# Altium footprint library North POLE.PcbLib: 419 footprints (part 2 of 27)
Each footprint in its own frame and in the unit in brackets; x right, y up, seen from the top. Pads: shape width x height; smd on the part's side, far side on the other; paste and mask are expansions set on the pad; w line width, h text height; cw(c..) or ccw(c..) is an arc to the next point about the centre after c.
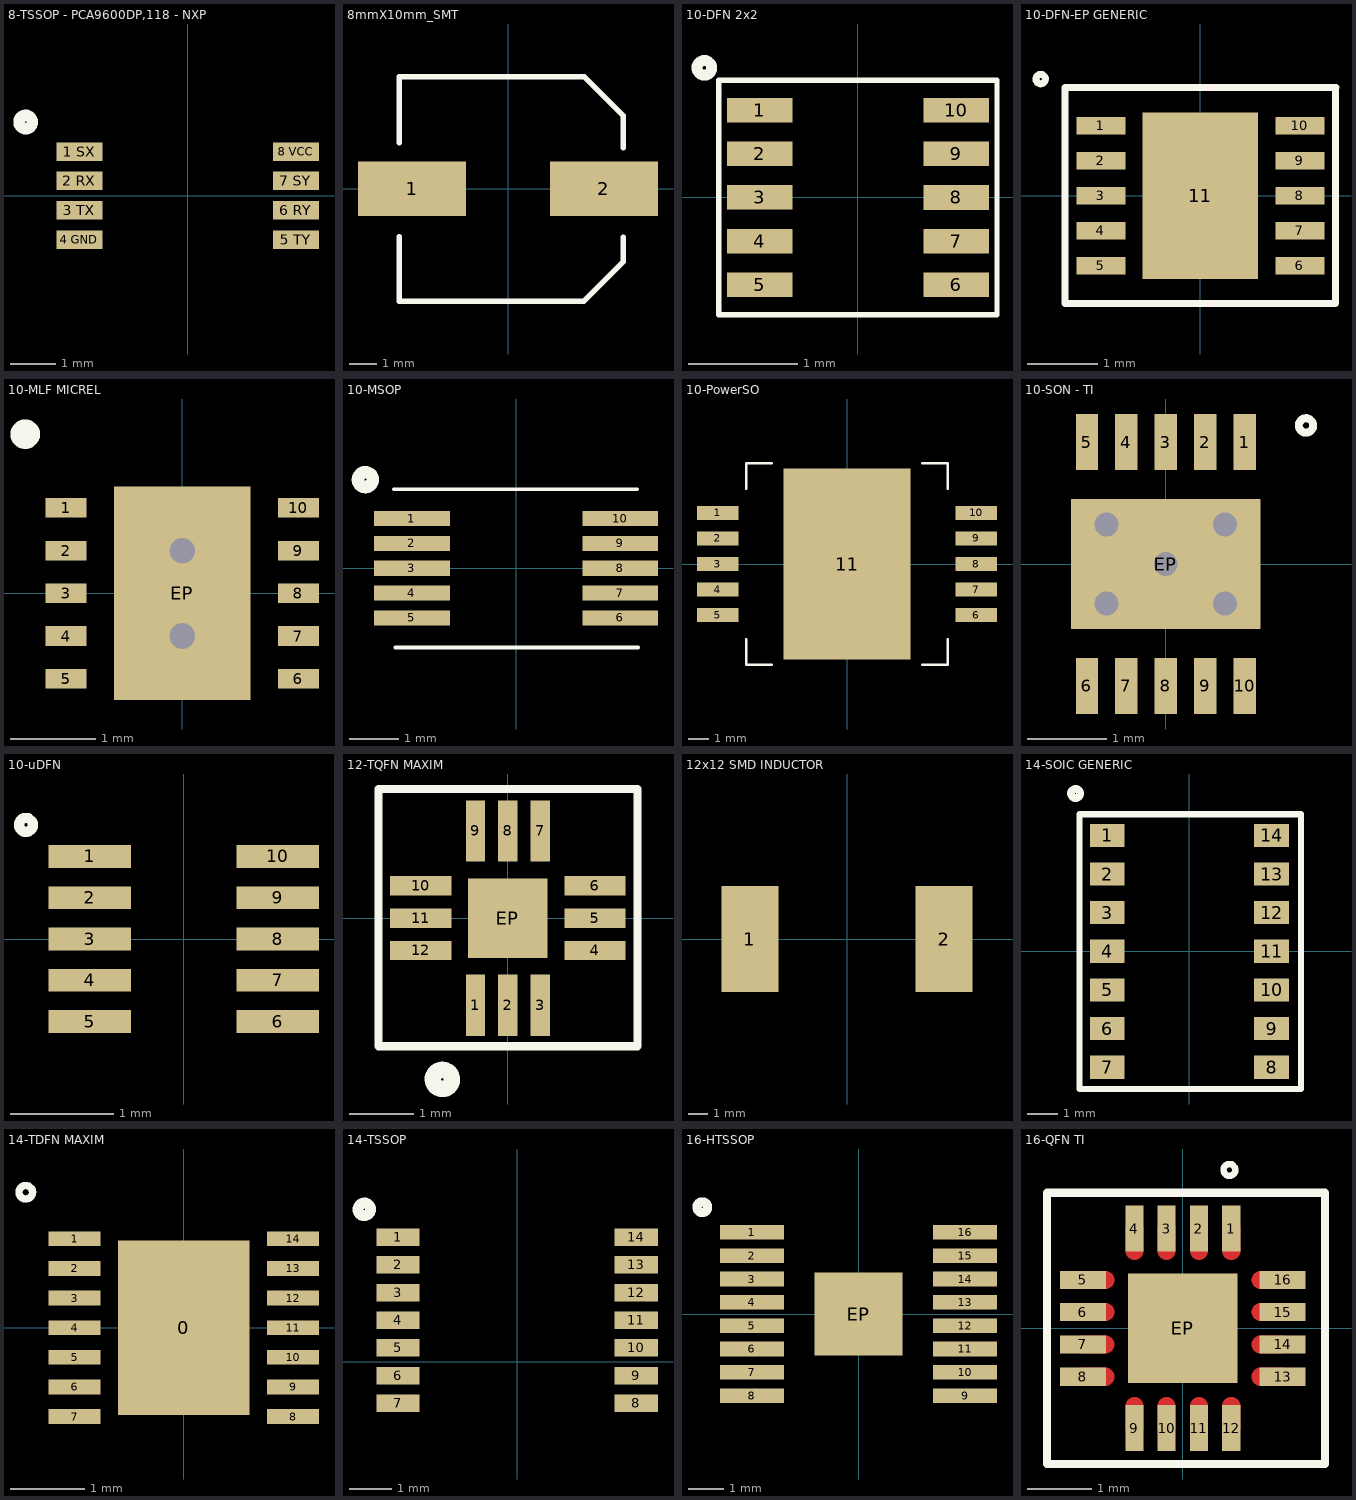
[diagram p1: the footprints below, top view; thin cyan lines are the x and y axes]

## 8-TSSOP - PCA9600DP,118 - NXP [mm]
pads (8):
  rect 1.02x0.41 smd: "1 SX"(-2.4,0.975) "2 RX"(-2.4,0.325) "3 TX"(-2.4,-0.325) "4 GND"(-2.4,-0.975) "5 TY"(2.4,-0.975) "6 RY"(2.4,-0.325) "7 SY"(2.4,0.325) "8 VCC"(2.4,0.975)
Top Overlay:
  lines w0.254: -3.501,1.748 ccw(c-3.592,1.631) -3.48,1.727

## 8mmX10mm_SMT [mm]
pads (2):
  rect 4x2 smd: 1(-3.55,0) 2(3.55,0)
Top Overlay:
  lines w0.2: -4.03,-1.77 -4.03,-4.16 2.807,-4.16 4.26,-2.707 4.26,-1.8 ; -4.03,1.7 -4.03,4.14 2.827,4.14 4.26,2.707 4.26,1.52

## 10-DFN 2x2 [mm]
pads (10):
  rect 0.6x0.225 smd mask+0.04: 1(-0.9,0.8) 2(-0.9,0.4) 3(-0.9,0) 4(-0.9,-0.4) 5(-0.9,-0.8) 6(0.9,-0.8) 7(0.9,-0.4) 8(0.9,0) 9(0.9,0.4) 10(0.9,0.8)
Top Overlay:
  lines w0.05: -1.275,-1.075 -1.275,1.075 1.275,1.075 1.275,-1.075 -1.275,-1.075
  lines w0.1: -1.372,1.246 ccw(c-1.406,1.188) -1.35,1.225
Top Solder:
  rectangle: -1.25,-0.95 -0.55,0.95
  rectangle: 0.55,-0.95 1.25,0.95
3D body: height 0.9, standoff 0, extent -1,-1 1,1

## 10-DFN-EP GENERIC [mm]
pads (11):
  rect 0.7x0.25 smd mask+0.04: 1(-1.425,1) 2(-1.425,0.5) 3(-1.425,0) 4(-1.425,-0.5) 5(-1.425,-1) 6(1.425,-1) 7(1.425,-0.5) 8(1.425,0) 9(1.425,0.5) 10(1.425,1)
  rect 1.65x2.38 smd mask+0.04: 11(0,0)
Top Overlay:
  lines w0.1: -2.25,1.727 ccw(c-2.285,1.669) -2.229,1.707 ; 1.935,1.544 1.935,-1.544 -1.935,-1.544 -1.935,1.549 1.941,1.549
3D body: height 0.75, standoff 0, extent -1.631,-1.407 1.623,1.44

## 10-MLF MICREL [mm]
pads (11):
  rect 0.48x0.23 smd mask+0.05: 1(-1.36,1) 2(-1.36,0.5) 3(-1.36,0) 4(-1.36,-0.5) 5(-1.36,-1) 6(1.36,-1) 7(1.36,-0.5) 8(1.36,0) 9(1.36,0.5) 10(1.36,1)
  rect 1.6x2.5 smd mask+0.05: EP(0,0)
via 0,0.5 diameter 0.45 hole 0.3
via 0,-0.5 diameter 0.45 hole 0.3
Top Overlay:
  lines w0.2: -1.8,1.926 ccw(c-1.838,1.864) -1.778,1.905
3D body: height 0.6, standoff 0, extent -1.499,-1.511 1.499,1.511

## 10-MSOP [mil]
pads (10):
  rect 60x12.01 smd mask+2.95: 1(-82.5,39.37) 2(-82.5,19.69) 3(-82.5,0) 4(-82.5,-19.68) 5(-82.5,-39.37) 6(82.5,-39.37) 7(82.5,-19.69) 8(82.5,0) 9(82.5,19.68) 10(82.5,39.37)
Top Overlay:
  lines w3: -96.85,62.56 95.75,62.56 ; -95.71,-62.95 96.89,-62.95
  lines w10: -115.85,74.81 ccw(c-119.43,70.21) -115,74
3D body: height 45.28, standoff 0, extent -96.45,-59.05 96.46,59.06

## 10-PowerSO [mm]
pads (11):
  rect 2.05x0.7 smd mask+0.08: 1(-6.425,2.54) 2(-6.425,1.27) 3(-6.425,0) 4(-6.425,-1.27) 5(-6.425,-2.54) 6(6.425,-2.54) 7(6.425,-1.27) 8(6.425,0) 9(6.425,1.27) 10(6.425,2.54)
  rect 6.3x9.5 smd mask+0.08: 11(0,0)
Top Overlay:
  lines w0.127: -5,-3.75 -5,-5 -3.75,-5 ; -5,3.75 -5,5 -3.75,5 ; 3.75,-5 5,-5 5,-3.75 ; 3.75,5 5,5 5,3.75
3D body: height 3.7, standoff 0, extent -4.75,-4.5 4.75,4.5
3D body: height 1.35, standoff 0, extent -3.8,-4.8 3.8,4.8

## 10-SON - TI [mm]
pads (11):
  rect 0.28x0.71 smd paste+0 mask+0.05: 1(1,1.545) 2(0.5,1.545) 3(0,1.545) 4(-0.5,1.545) 5(-1,1.545) 6(-1,-1.545) 7(-0.5,-1.545) 8(0,-1.545) 9(0.5,-1.545) 10(1,-1.545)
  rect 2.4x1.65 smd mask+0.05: EP(0,0)
via 0.75,-0.5 diameter 0.45 hole 0.3
via -0.75,-0.5 diameter 0.45 hole 0.3
via 0.75,0.5 diameter 0.45 hole 0.3
via 0,0 diameter 0.45 hole 0.3
via -0.75,0.5 diameter 0.45 hole 0.3
Top Overlay:
  lines w0.1: 1.826,1.832 ccw(c1.776,1.755) 1.854,1.803
3D body: height 1, standoff 0, extent -1.499,-1.498 1.499,1.499

## 10-uDFN [mm]
pads (10):
  rect 0.8x0.22 smd mask+0.04: 1(-0.91,0.8) 2(-0.91,0.4) 3(-0.91,0) 4(-0.91,-0.4) 5(-0.91,-0.8) 6(0.91,-0.8) 7(0.91,-0.4) 8(0.91,0) 9(0.91,0.4) 10(0.91,0.8)
Top Overlay:
  lines w0.1: -1.495,1.164 ccw(c-1.529,1.106) -1.473,1.143
3D body: height 0.75, standoff 0, extent -1.016,-1.016 1.067,1.016

## 12-TQFN MAXIM [mm]
pads (13):
  rect 0.3x0.95 smd mask+0.05: 1(-0.5,-1.35) 2(0,-1.35) 3(0.5,-1.35) 7(0.5,1.35) 8(0,1.35) 9(-0.5,1.35)
  rect 0.95x0.3 smd mask+0.05: 4(1.35,-0.5) 5(1.35,0) 6(1.35,0.5) 10(-1.35,0.5) 11(-1.35,0) 12(-1.35,-0.5)
  rect 1.23x1.23 smd mask+0.05: EP(0,0)
Top Overlay:
  lines w0.127: -2,-1.981 -2,2 2.007,2 2.007,-1.981 -2,-1.981
  lines w0.254: -0.922,-2.379 ccw(c-1.012,-2.496) -0.9,-2.4
3D body: height 0.6, standoff 0, extent -1.499,-1.499 1.499,1.524

## 12x12 SMD INDUCTOR [mm]
pads (2):
  rect 2.9x5.4 smd mask+0.08: 1(-4.95,0) 2(4.95,0)
3D body: height 6.21, standoff -0.09, extent -5.973,-6.147 6.227,6.053

## 14-SOIC GENERIC [mil]
pads (14):
  rect 45x30 smd: 1(-106.3,150) 2(-106.3,100) 3(-106.3,50) 4(-106.3,0) 5(-106.3,-50) 6(-106.3,-100) 7(-106.3,-150) 8(106.3,-150) 9(106.3,-100) 10(106.3,-50) 11(106.3,0) 12(106.3,50) 13(106.3,100) 14(106.3,150)
Top Overlay:
  lines w7.87: -142.56,-178.23 -142.56,177.36 144.25,177.36 144.25,-178.23 -142.56,-178.23
  lines w10: -143.85,208.81 ccw(c-147.43,204.21) -143,208
3D body: height 68.9, standoff 0, extent -113.17,-168.31 115.18,168.31

## 14-TDFN MAXIM [mm]
pads (15):
  rect 1.78x2.35 smd: 0(0,0)
  rect 0.7x0.2 smd paste+0 mask+0.05: 1(-1.475,1.2) 2(-1.475,0.8) 3(-1.475,0.4) 4(-1.475,0) 5(-1.475,-0.4) 6(-1.475,-0.8) 7(-1.475,-1.2) 8(1.475,-1.2) 9(1.475,-0.8) 10(1.475,-0.4) 11(1.475,0) 12(1.475,0.4) 13(1.475,0.8) 14(1.475,1.2)
Top Overlay:
  lines w0.1: -2.083,1.905 ccw(c-2.133,1.828) -2.055,1.876
3D body: height 0.8, standoff 0, extent -1.499,-1.499 1.499,1.499

## 14-TSSOP [mm]
pads (14):
  rect 1.02x0.41 smd: 1(-2.8,2.925) 2(-2.8,2.275) 3(-2.8,1.625) 4(-2.8,0.975) 5(-2.8,0.325) 6(-2.8,-0.325) 7(-2.8,-0.975) 8(2.8,-0.975) 9(2.8,-0.325) 10(2.8,0.325) 11(2.8,0.975) 12(2.8,1.625) 13(2.8,2.275) 14(2.8,2.925)
Top Overlay:
  lines w0.254: -3.501,3.698 ccw(c-3.592,3.581) -3.48,3.677
3D body: height 1.2, standoff 0, extent -3.2,-1.58 3.2,3.52

## 16-HTSSOP [mm]
pads (17):
  rect 1.78x0.41 smd: 1(-2.97,2.275) 2(-2.97,1.625) 3(-2.97,0.975) 4(-2.97,0.325) 5(-2.97,-0.325) 6(-2.97,-0.975) 7(-2.97,-1.625) 8(-2.97,-2.275) 9(2.97,-2.275) 10(2.97,-1.625) 11(2.97,-0.975) 12(2.97,-0.325) 13(2.97,0.325) 14(2.97,0.975) 15(2.97,1.625) 16(2.97,2.275)
  rect 2.46x2.31 smd: EP(0,0)
Top Overlay:
  lines w0.254: -4.263,3.094 ccw(c-4.354,2.977) -4.242,3.073
3D body: height 1.1, standoff 0, extent -3.2,-2.5 3.2,2.5

## 16-QFN TI [mm]
pads (17):
  rect 0.28x0.71 smd paste+0 mask+0.05: 1(0.75,1.545) 2(0.25,1.545) 3(-0.25,1.545) 4(-0.75,1.545) 9(-0.75,-1.545) 10(-0.25,-1.545) 11(0.25,-1.545) 12(0.75,-1.545)
  rect 0.71x0.28 smd paste+0 mask+0.05: 5(-1.545,0.75) 6(-1.545,0.25) 7(-1.545,-0.25) 8(-1.545,-0.75) 13(1.545,-0.75) 14(1.545,-0.25) 15(1.545,0.25) 16(1.545,0.75)
  rect 1.7x1.7 smd mask+0.05: EP(0,0)
Top Layer:
  lines w0.28: -1.545,-0.75 -1.2,-0.75 ; -1.545,-0.25 -1.2,-0.25 ; -1.545,0.25 -1.2,0.25 ; -1.545,0.75 -1.2,0.75 ; -0.75,-1.545 -0.75,-1.2 ; -0.75,1.2 -0.75,1.545 ; -0.25,-1.545 -0.25,-1.2 ; -0.25,1.2 -0.25,1.545 ; 0.25,-1.545 0.25,-1.2 ; 0.25,1.2 0.25,1.545 ; 0.75,-1.545 0.75,-1.2 ; 0.75,1.2 0.75,1.545 ; 1.2,-0.75 1.545,-0.75 ; 1.2,-0.25 1.545,-0.25 ; 1.2,0.25 1.545,0.25 ; 1.2,0.75 1.545,0.75
Top Overlay:
  lines w0.1: 0.772,2.529 ccw(c0.722,2.452) 0.8,2.5
  lines w0.127: -2.1,-2.1 2.2,-2.1 2.2,2.1 -2.1,2.1 -2.1,-2.1
Top Solder:
  lines w0.127: -1.179,-0.878 ccw(c-1.2,-0.75) -1.147,-0.631 ; -1.179,-0.378 ccw(c-1.2,-0.25) -1.147,-0.131 ; -1.179,0.122 ccw(c-1.2,0.25) -1.147,0.369 ; -1.179,0.622 ccw(c-1.2,0.75) -1.147,0.869 ; -0.878,1.179 ccw(c-0.75,1.2) -0.631,1.147 ; -0.869,-1.147 cw(c-0.75,-1.2) -0.622,-1.179 ; -0.378,1.179 ccw(c-0.25,1.2) -0.131,1.147 ; -0.369,-1.147 cw(c-0.25,-1.2) -0.122,-1.179 ; 0.122,1.179 ccw(c0.25,1.2) 0.369,1.147 ; 0.131,-1.147 cw(c0.25,-1.2) 0.378,-1.179 ; 0.622,1.179 ccw(c0.75,1.2) 0.869,1.147 ; 0.631,-1.147 cw(c0.75,-1.2) 0.878,-1.179 ; 1.147,-0.869 cw(c1.2,-0.75) 1.179,-0.622 ; 1.147,-0.369 cw(c1.2,-0.25) 1.179,-0.122 ; 1.147,0.131 cw(c1.2,0.25) 1.179,0.378 ; 1.147,0.631 cw(c1.2,0.75) 1.179,0.878
3D body: height 1, standoff 0, extent -1.499,-1.498 1.499,1.499